# Altium footprint library North POLE.PcbLib: 419 footprints (part 14 of 27)
Each footprint in its own frame and in the unit in brackets; x right, y up, seen from the top. Pads: shape width x height; smd on the part's side, far side on the other; paste and mask are expansions set on the pad; w line width, h text height; cw(c..) or ccw(c..) is an arc to the next point about the centre after c.
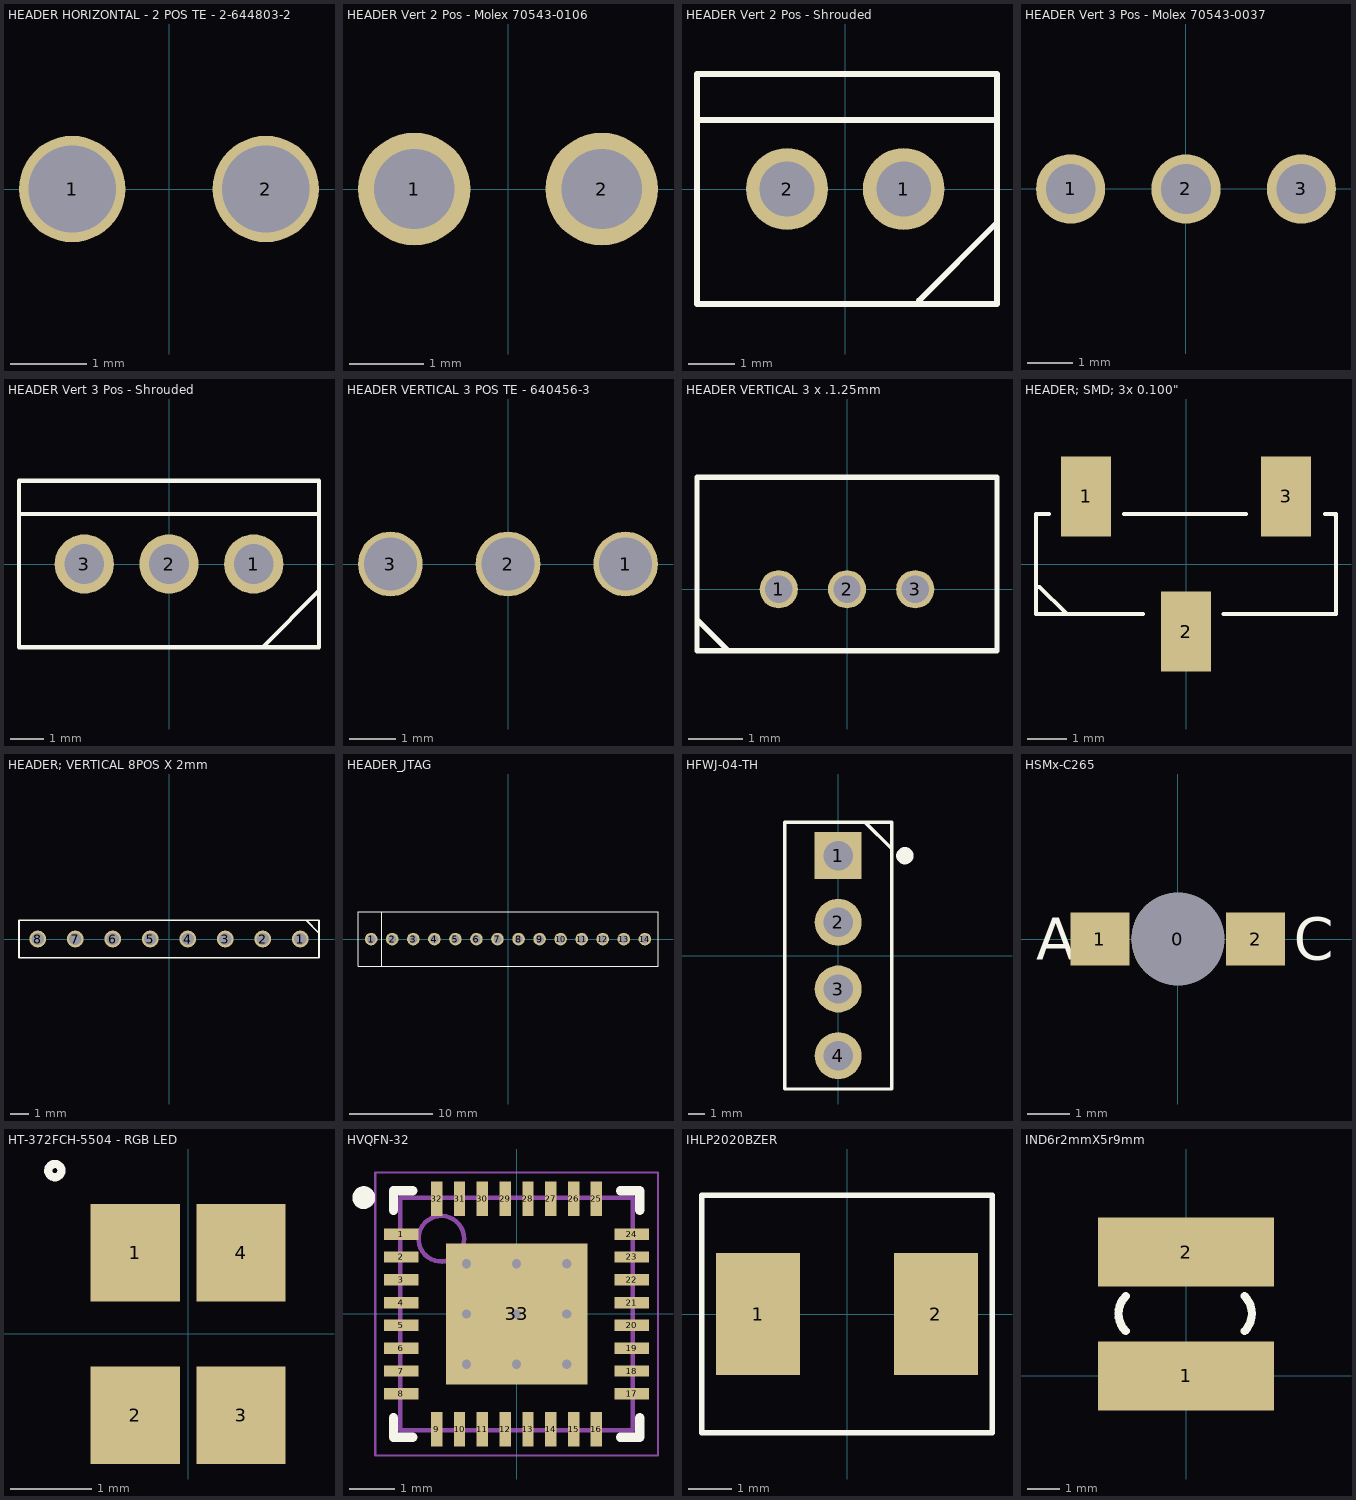
[diagram p13: the footprints below, top view; thin cyan lines are the x and y axes]

## HEADER HORIZONTAL - 2 POS TE - 2-644803-2 [mil]
pads (2):
  round 55 hole 45: 1(-50,0) 2(50,0)
3D body: height 352.6, standoff -120.4, extent -142.3,-10 142.3,420

## HEADER Vert 2 Pos - Molex 70543-0106 [mil]
pads (2):
  round 60 hole 42.91: 1(-50,0) 2(50,0)
3D body: height 475, standoff -120, extent -144.99,-99.99 145,150.01

## HEADER Vert 2 Pos - Shrouded [mil]
pads (2):
  round 70 hole 47: 1(50,0) 2(-50,0)
Top Overlay:
  lines w5: -127.17,-31.5 -127.17,-23.62 ; -127.17,59.06 129.92,59.06 ; 62.99,-95.67 129.92,-28.74 ; -127.17,-98.43 129.92,-98.43 129.92,98.43 -127.17,98.43 -127.17,-98.43

## HEADER Vert 3 Pos - Molex 70543-0037 [mil]
pads (3):
  round 60 hole 42.91: 1(-100,0) 2(0,0) 3(100,0)
3D body: height 469.09, standoff -125.91, extent -199.99,-99.99 200.01,160.01

## HEADER Vert 3 Pos - Shrouded [mil]
pads (3):
  round 70 hole 47: 1(100,0) 2(0,0) 3(-100,0)
Top Overlay:
  lines w5: -177.17,-31.5 -177.17,-23.62 ; -177.17,59.06 177.17,59.06 ; 110.24,-98.43 177.17,-31.5 ; -177.17,-98.43 -177.17,98.43 177.17,98.43 177.17,-98.43 -177.17,-98.43

## HEADER VERTICAL 3 POS TE - 640456-3 [mil]
pads (3):
  round 55 hole 45 unplated mask+3.15: 1(100,0) 2(0,0) 3(-100,0)

## HEADER VERTICAL 3 x .1.25mm [mm]
pads (3):
  round 0.7 hole 0.5 mask+0.08: 1(-1.25,0) 2(0,0) 3(1.25,0)
Top Overlay:
  lines w0.1: -2.75,-0.47 -2.75,-0.555 -2.18,-1.125 ; -2.75,-1.125 2.75,-1.125 2.75,2.05 -2.75,2.05 -2.75,-1.125

## HEADER; SMD; 3x 0.100" [mm]
pads (3):
  rect 1.27x2.032 smd mask+0.08: 1(-2.54,1.715) 2(0,-1.715) 3(2.54,1.715)
Top Overlay:
  lines w0.1: -3.81,-0.58 -3.72,-0.58 -3.05,-1.25 ; -3.48,1.27 -3.81,1.27 -3.81,-1.27 -1.09,-1.27 ; -1.58,1.27 1.52,1.27 ; 0.95,-1.27 3.81,-1.27 3.81,1.27 ; 3.53,1.27 3.81,1.27 ; 3.79,1.25 3.81,1.27

## HEADER; VERTICAL 8POS X 2mm [mm]
pads (8):
  round 0.9 hole 0.65: 1(7,0) 2(5,0) 3(3,0) 4(1,0) 5(-1,0) 6(-3,0) 7(-5,0) 8(-7,0)
Top Overlay:
  lines w0.1: 7.25,1 7.31,1 8,0.31 ; -8,-1 -8,1 8,1 8,-1 -8,-1

## HEADER_JTAG [mil]
pads (14):
  round 60 hole 40: 1(-650,0) 2(-550,0) 3(-450,0) 4(-350,0) 5(-250,0) 6(-150,0) 7(-50,0) 8(50,0) 9(150,0) 10(250,0) 11(350,0) 12(450,0) 13(550,0) 14(650,0)
Top Overlay:
  lines w3: -600.83,-128.94 -600.83,130.59 ; -712.64,-129.61 -712.64,129.88 712.64,129.88 712.64,-129.61 -712.64,-129.61

## HFWJ-04-TH [mil]
pads (4):
  rect 110x110 hole 69 mask+3: 1(0,234)
  round 110 hole 69 mask+3: 2(0,78) 3(0,-78) 4(0,-234)
Top Overlay:
  circle w20: c156,234 r10.29
  lines w8: 64,311 125,250 ; -125,-312 -125,312 125,312 125,-312 -125,-312
Mechanical 12:
  region: 156,390
3D body: height 625, standoff -195, extent -125,0 125,312
3D body: height 625, standoff -195, extent -125,-312 125,0

## HSMx-C265 [mm]
pads (3):
  round 2.2 hole 2.21 unplated: 0(0,0)
  rect 1.4x1.25 smd mask+0.08: 1(-1.85,0) 2(1.85,0)
Top Overlay:
  text "A" at -3.37,-0.49 h1
  text "C" at 2.76,-0.49 h1

## HT-372FCH-5504 - RGB LED [mm]
pads (4):
  rect 1.1x1.2 smd mask+0.08: 1(-0.65,1) 2(-0.65,-1) 3(0.65,-1) 4(0.65,1)
Top Overlay:
  lines w0.1: -1.596,2.078 ccw(c-1.641,2.01) -1.575,2.057
3D body: height 0.5, standoff 0, extent -0.635,-0.991 0.686,1.016

## HVQFN-32 [mm] "NXP CLRC66301HN1"
height 1
pads (33):
  rect 0.75x0.25 smd: 1(-2.525,1.75) 2(-2.525,1.25) 3(-2.525,0.75) 4(-2.525,0.25) 5(-2.525,-0.25) 6(-2.525,-0.75) 7(-2.525,-1.25) 8(-2.525,-1.75) 17(2.525,-1.75) 18(2.525,-1.25) 19(2.525,-0.75) 20(2.525,-0.25) 21(2.525,0.25) 22(2.525,0.75) 23(2.525,1.25) 24(2.525,1.75)
  rect 0.25x0.75 smd: 9(-1.75,-2.525) 10(-1.25,-2.525) 11(-0.75,-2.525) 12(-0.25,-2.525) 13(0.25,-2.525) 14(0.75,-2.525) 15(1.25,-2.525) 16(1.75,-2.525) 25(1.75,2.525) 26(1.25,2.525) 27(0.75,2.525) 28(0.25,2.525) 29(-0.25,2.525) 30(-0.75,2.525) 31(-1.25,2.525) 32(-1.75,2.525)
  rect 3.1x3.1 smd: 33(0,0)
via 1.1,-1.1 diameter 0.5 hole 0.2
via 0,-1.1 diameter 0.5 hole 0.2
via -1.1,-1.1 diameter 0.5 hole 0.2
via 1.1,0 diameter 0.5 hole 0.2
via 0,0 diameter 0.5 hole 0.2
via -1.1,0 diameter 0.5 hole 0.2
via 1.1,1.1 diameter 0.5 hole 0.2
via 0,1.1 diameter 0.5 hole 0.2
via -1.1,1.1 diameter 0.5 hole 0.2
Top Overlay:
  circle w0.25: c-3.35,2.55 r0.125
  lines w0.2: -2.7,-2.275 -2.7,-2.7 -2.275,-2.7 ; -2.7,2.275 -2.7,2.7 -2.275,2.7 ; 2.275,-2.7 2.7,-2.7 2.7,-2.275 ; 2.275,2.7 2.7,2.7 2.7,2.275
Mechanical 13:
  circle w0.1: c-1.65,1.65 r0.5
  lines w0.1: -2.55,-2.55 2.55,-2.55 2.55,2.55 -2.55,2.55 -2.55,-2.55
Mechanical 15:
  lines w0.05: -3.1,-3.1 3.1,-3.1 3.1,3.1 -3.1,3.1 -3.1,-3.1
  lines w0.1: -0.5,0 0.5,0 ; 0,-0.5 0,0.5
3D body: height 1, standoff 0.05, extent -2.55,-2.55 2.55,2.55

## IHLP2020BZER [mil]
pads (2):
  rect 75.5x110 smd: 1(-80.25,0) 2(80.24,0)
Top Overlay:
  lines w5: -131.01,-107 130.97,-107 ; -130.98,-106.97 -130.98,107 131,107 131,-106.97
3D body: height 78.74, standoff 0, extent -112.99,-107.01 113,107

## IND6r2mmX5r9mm [mm]
pads (2):
  rect 5.5x2.15 smd: 1(0,0) 2(0,3.861)
Top Overlay:
  lines w0.254: -1.88,1.397 cw(c-1.333,1.943) -1.88,2.489 ; 1.829,1.397 ccw(c1.283,1.943) 1.829,2.489